# Altium footprint library B-NT_CHIPS.PcbLib: 90 footprints (part 2 of 6)
Each footprint in its own frame and in the unit in brackets; x right, y up, seen from the top. Pads: shape width x height; smd on the part's side, far side on the other; paste and mask are expansions set on the pad; w line width, h text height; cw(c..) or ccw(c..) is an arc to the next point about the centre after c.
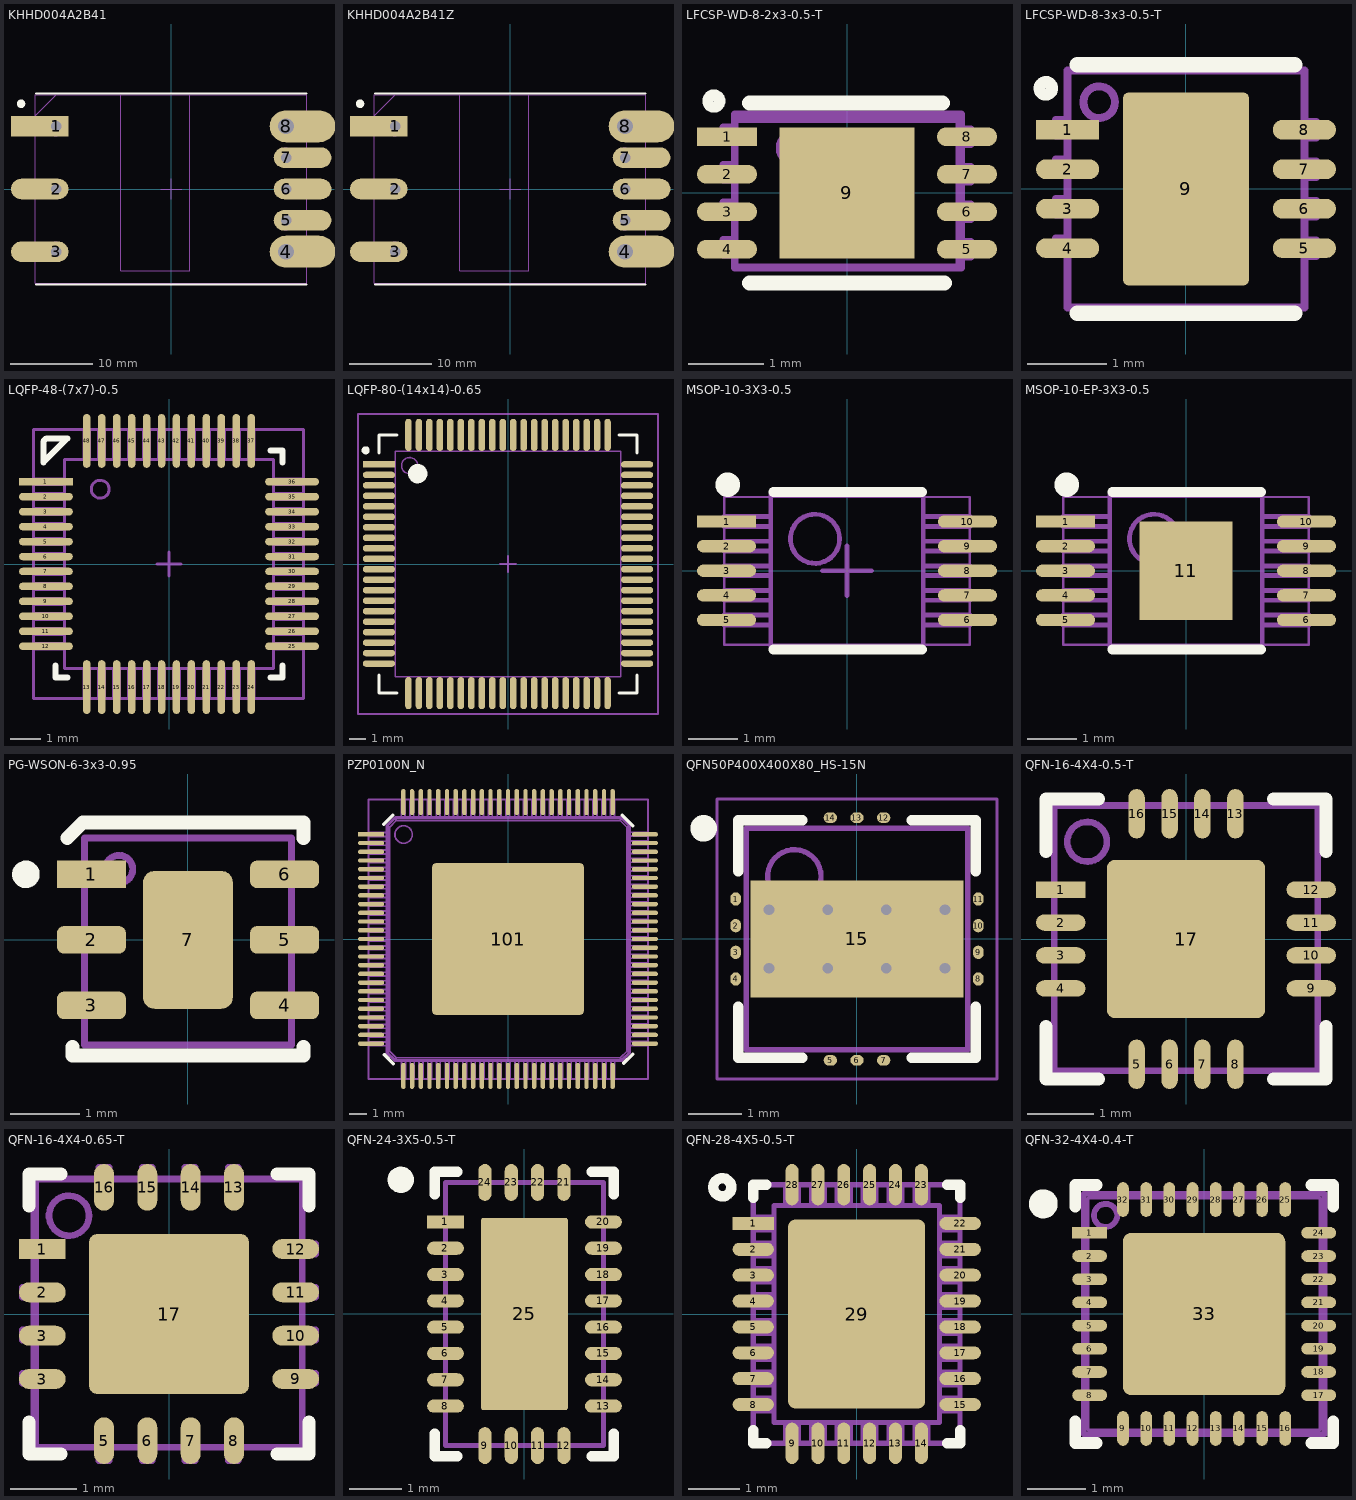
[diagram p1: the footprints below, top view; thin cyan lines are the x and y axes]

## KHHD004A2B41 [mm]
height 9.398
pads (8):
  rect 7x2.5 hole 1.27 copper offset -2,0: 1(-13.97,7.62)
  oval 7x2.5 hole 1.27 copper offset -2,0: 2(-13.97,0) 3(-13.97,-7.62)
  oval 8x3.9 hole 1.93 copper offset 2,0: 4(13.97,-7.62) 8(13.97,7.62)
  oval 7x2.5 hole 1.27 copper offset 2,0: 5(13.97,-3.81) 6(13.97,0) 7(13.97,3.81)
Top Overlay:
  circle w0.508: c-18.237,10.363 r0.254
  lines w0.2: -16.45,-11.6 0,-11.6 16.45,-11.6 ; -16.45,11.6 0,11.6 16.45,11.6
M3 Top Assy:
  circle w0.1: c13.97,-7.62 r1.524
  circle w0.1: c13.97,-3.81 r1.143
  circle w0.1: c13.97,0 r1.143
  circle w0.1: c13.97,3.81 r1.143
  circle w0.1: c13.97,7.62 r1.524
  circle w0.1: c-13.97,-7.62 r1.143
  circle w0.1: c-13.97,0 r1.143
  circle w0.1: c-13.97,7.62 r1.143
  lines w0.1: -6.096,11.43 -6.096,-9.906 2.286,-9.906 2.286,11.43 ; -16.51,-11.43 -16.51,8.89 -13.97,11.43 16.51,11.43 16.51,-11.43 -16.51,-11.43
M8 Top Brd Anno:
  lines w0.1: -1.27,0 1.27,0 ; 0,-1.27 0,1.27 ; -16.51,-11.43 16.51,-11.43 16.51,11.43 -16.51,11.43 -16.51,-11.43
3D body "KHHD004A2B41Z(PCB).STEP": height 9.31, standoff -4.79, extent -16.456,-11.419 16.544,11.481

## KHHD004A2B41Z [mm]
pads (8):
  rect 7x2.5 hole 1.27 copper offset -2,0: 1(-13.97,7.62)
  oval 7x2.5 hole 1.27 copper offset -2,0: 2(-13.97,0) 3(-13.97,-7.62)
  oval 8x3.9 hole 1.93 copper offset 2,0: 4(13.97,-7.62) 8(13.97,7.62)
  oval 7x2.5 hole 1.27 copper offset 2,0: 5(13.97,-3.81) 6(13.97,0) 7(13.97,3.81)
Top Overlay:
  circle w0.508: c-18.237,10.363 r0.254
  lines w0.2: -16.45,-11.6 0,-11.6 16.45,-11.6 ; -16.45,11.6 0,11.6 16.45,11.6
M3 Top Assy:
  circle w0.1: c-13.97,7.62 r1.143
  circle w0.1: c-13.97,0 r1.143
  circle w0.1: c-13.97,-7.62 r1.143
  circle w0.1: c13.97,7.62 r1.524
  circle w0.1: c13.97,3.81 r1.143
  circle w0.1: c13.97,0 r1.143
  circle w0.1: c13.97,-3.81 r1.143
  circle w0.1: c13.97,-7.62 r1.524
  lines w0.1: -6.096,11.43 -6.096,-9.906 2.286,-9.906 2.286,11.43 ; -16.51,-11.43 16.51,-11.43 16.51,11.43 -13.97,11.43 -16.51,8.89 -16.51,-11.43
M8 Top Brd Anno:
  lines w0.1: -1.27,0 1.27,0 ; 0,-1.27 0,1.27 ; -16.51,-11.43 -16.51,11.43 16.51,11.43 16.51,-11.43 -16.51,-11.43
3D body "KHHD004A2B41Z(PCB).STEP": height 9.31, standoff -4.79, extent -16.456,-11.419 16.544,11.481

## LFCSP-WD-8-2х3-0.5-T [mm]
height 0.85
pads (9):
  rect 0.8x0.25 smd: 1(-1.6,0.75)
  oval 0.8x0.25 smd: 2(-1.6,0.25) 3(-1.6,-0.25) 4(-1.6,-0.75) 5(1.6,-0.75) 6(1.6,-0.25) 7(1.6,0.25) 8(1.6,0.75)
  rect 1.8x1.75 smd: 9(0,0)
Top Overlay:
  circle w0.15: c-1.775,1.225 r0.08
  lines w0.2: -1.3,-1.2 1.3,-1.2 ; -1.3,1.2 1.275,1.2
M3 Top Assy:
  circle w0.1: c-0.7,0.6 r0.2
  lines w0.1: -1.55,-0.825 -1.65,-0.825 -1.65,-0.625 -1.55,-0.625 ; -1.55,-0.325 -1.65,-0.325 -1.65,-0.125 -1.55,-0.125 ; -1.55,0.175 -1.65,0.175 -1.65,0.375 -1.55,0.375 ; -1.55,0.675 -1.65,0.675 -1.65,0.875 -1.55,0.875 ; 1.55,-0.85 1.65,-0.85 1.65,-0.65 1.55,-0.65 ; 1.55,-0.35 1.65,-0.35 1.65,-0.15 1.55,-0.15 ; 1.55,0.15 1.65,0.15 1.65,0.35 1.55,0.35 ; 1.55,0.65 1.65,0.65 1.65,0.85 1.55,0.85 ; -1.5,-0.993 -1.5,0.982 1.499,0.982 1.5,0.982 1.5,-0.993 -1.5,-0.993
M8 Top Brd Anno:
  lines w0.1: -0.5,0 0.5,0 ; 0,-0.5 0,0.5 ; -1.5,-1 -1.5,1.05 0.2,1.05 1.525,1.05 1.525,-1 -0.25,-1 -1.5,-1
3D body "User Library-ADG1401BCPZ-REEL7.STEP": height 0.74, standoff -0.01, extent -1.501,-1 1.501,1

## LFCSP-WD-8-3х3-0.5-T [mm] "8-Lead Frame Chip Scale Package [LFCSP_WD]  3 mm ? 3 mm Body"
height 0.85
pads (9):
  rect 0.8x0.25 smd: 1(-1.5,0.75)
  oval 0.8x0.25 smd: 2(-1.5,0.25) 3(-1.5,-0.25) 4(-1.5,-0.75) 5(1.5,-0.75) 6(1.5,-0.25) 7(1.5,0.25) 8(1.5,0.75)
  rrect10% 1.6x2.45 smd: 9(0,0)
Top Overlay:
  circle w0.15: c-1.775,1.275 r0.08
  lines w0.2: -1.375,-1.575 1.375,-1.575 ; -1.375,1.575 1.375,1.575
M3 Top Assy:
  circle w0.1: c-1.1,1.1 r0.2
  lines w0.1: -1.55,-0.825 -1.65,-0.825 -1.65,-0.625 -1.55,-0.625 ; -1.55,-0.325 -1.65,-0.325 -1.65,-0.125 -1.55,-0.125 ; -1.55,0.175 -1.65,0.175 -1.65,0.375 -1.55,0.375 ; -1.55,0.675 -1.65,0.675 -1.65,0.875 -1.55,0.875 ; 1.55,-0.85 1.65,-0.85 1.65,-0.65 1.55,-0.65 ; 1.55,-0.35 1.65,-0.35 1.65,-0.15 1.55,-0.15 ; 1.55,0.15 1.65,0.15 1.65,0.35 1.55,0.35 ; 1.55,0.65 1.65,0.65 1.65,0.85 1.55,0.85 ; -1.5,-1.5 1.5,-1.5 1.5,1.5 -1.5,1.5 -1.5,-1.5
M8 Top Brd Anno:
  lines w0.1: -0.5,0 0.5,0 ; 0,-0.5 0,0.5 ; -1.5,-1.5 0,-1.5 1.5,-1.5 1.5,1.5 0,1.5 -1.5,1.5 -1.5,-1.5
3D body "User Library-DFN-8.STEP": height 0.75, standoff -0.05, extent -1.51,-1.5 1.51,1.5

## LQFP-48-(7x7)-0.5 [mm] "Body 7.2x7.2x1.6mm(max)"
height 1.6
pads (48):
  rect 1.8x0.25 smd: 1(-4.115,2.75)
  oval 1.8x0.25 smd: 2(-4.115,2.25) 3(-4.115,1.75) 4(-4.115,1.25) 5(-4.115,0.75) 6(-4.115,0.25) 7(-4.115,-0.25) 8(-4.115,-0.75) 9(-4.115,-1.25) 10(-4.115,-1.75) 11(-4.115,-2.25) 12(-4.115,-2.75) 25(4.115,-2.75) 26(4.115,-2.25) 27(4.115,-1.75) 28(4.115,-1.25) 29(4.115,-0.75) 30(4.115,-0.25) 31(4.115,0.25) 32(4.115,0.75) 33(4.115,1.25) 34(4.115,1.75) 35(4.115,2.25) 36(4.115,2.75)
  oval 0.25x1.8 smd: 13(-2.75,-4.115) 14(-2.25,-4.115) 15(-1.75,-4.115) 16(-1.25,-4.115) 17(-0.75,-4.115) 18(-0.25,-4.115) 19(0.25,-4.115) 20(0.75,-4.115) 21(1.25,-4.115) 22(1.75,-4.115) 23(2.25,-4.115) 24(2.75,-4.115) 37(2.75,4.115) 38(2.25,4.115) 39(1.75,4.115) 40(1.25,4.115) 41(0.75,4.115) 42(0.25,4.115) 43(-0.25,4.115) 44(-0.75,4.115) 45(-1.25,4.115) 46(-1.75,4.115) 47(-2.25,4.115) 48(-2.75,4.115)
Top Overlay:
  lines w0.2: -3.8,-3.4 -3.8,-3.8 -3.6,-3.8 -3.4,-3.8 ; 3.4,-3.8 3.8,-3.8 3.8,-3.6 3.8,-3.4 ; 3.4,3.8 3.6,3.8 3.8,3.8 3.8,3.4 ; -4.2,4.1 -4.1,4.2 ; -4.2,4.1 -4.2,3.4 -3.4,4.2 -4.1,4.2 ; -4.2,4.1 -4.1,4.2
M3 Top Assy:
  circle w0.1: c-2.3,2.5 r0.3
  lines w0.1: -3.5,-2.85 -4.5,-2.85 -4.5,-2.65 -3.5,-2.65 ; -3.5,-2.35 -4.5,-2.35 -4.5,-2.15 -3.5,-2.15 ; -3.5,-1.85 -4.5,-1.85 -4.5,-1.65 -3.5,-1.65 ; -3.5,-1.35 -4.5,-1.35 -4.5,-1.15 -3.5,-1.15 ; -3.5,-0.85 -4.5,-0.85 -4.5,-0.65 -3.5,-0.65 ; -3.5,-0.35 -4.5,-0.35 -4.5,-0.15 -3.5,-0.15 ; -3.5,0.15 -4.5,0.15 -4.5,0.35 -3.5,0.35 ; -3.5,0.65 -4.5,0.65 -4.5,0.85 -3.5,0.85 ; -3.5,1.15 -4.5,1.15 -4.5,1.35 -3.5,1.35 ; -3.5,1.65 -4.5,1.65 -4.5,1.85 -3.5,1.85 ; -3.5,2.15 -4.5,2.15 -4.5,2.35 -3.5,2.35 ; -3.5,2.65 -4.5,2.65 -4.5,2.85 -3.5,2.85 ; -2.85,-3.5 -2.85,-4.5 -2.65,-4.5 -2.65,-3.5 ; -2.85,3.5 -2.85,4.5 -2.65,4.5 -2.65,3.5 ; -2.35,-3.5 -2.35,-4.5 -2.15,-4.5 -2.15,-3.5 ; -2.35,3.5 -2.35,4.5 -2.15,4.5 -2.15,3.5 ; -1.85,-3.5 -1.85,-4.5 -1.65,-4.5 -1.65,-3.5 ; -1.85,3.5 -1.85,4.5 -1.65,4.5 -1.65,3.5 ; -1.35,-3.5 -1.35,-4.5 -1.15,-4.5 -1.15,-3.5 ; -1.35,3.5 -1.35,4.5 -1.15,4.5 -1.15,3.5 ; -0.85,-3.5 -0.85,-4.5 -0.65,-4.5 -0.65,-3.5 ; -0.85,3.5 -0.85,4.5 -0.65,4.5 -0.65,3.5 ; -0.35,-3.5 -0.35,-4.5 -0.15,-4.5 -0.15,-3.5 ; -0.35,3.5 -0.35,4.5 -0.15,4.5 -0.15,3.5 ; 0.15,-3.5 0.15,-4.5 0.35,-4.5 0.35,-3.5 ; 0.15,3.5 0.15,4.5 0.35,4.5 0.35,3.5 ; 0.65,-3.5 0.65,-4.5 0.85,-4.5 0.85,-3.5 ; 0.65,3.5 0.65,4.5 0.85,4.5 0.85,3.5 ; 1.15,-3.5 1.15,-4.5 1.35,-4.5 1.35,-3.5 ; 1.15,3.5 1.15,4.5 1.35,4.5 1.35,3.5 ; 1.65,-3.5 1.65,-4.5 1.85,-4.5 1.85,-3.5 ; 1.65,3.5 1.65,4.5 1.85,4.5 1.85,3.5 ; 2.15,-3.5 2.15,-4.5 2.35,-4.5 2.35,-3.5 ; 2.15,3.5 2.15,4.5 2.35,4.5 2.35,3.5 ; 2.65,-3.5 2.65,-4.5 2.85,-4.5 2.85,-3.5 ; 2.65,3.5 2.65,4.5 2.85,4.5 2.85,3.5 ; 3.5,-2.85 4.5,-2.85 4.5,-2.65 3.5,-2.65 ; 3.5,-2.35 4.5,-2.35 4.5,-2.15 3.5,-2.15 ; 3.5,-1.85 4.5,-1.85 4.5,-1.65 3.5,-1.65 ; 3.5,-1.35 4.5,-1.35 4.5,-1.15 3.5,-1.15 ; 3.5,-0.85 4.5,-0.85 4.5,-0.65 3.5,-0.65 ; 3.5,-0.35 4.5,-0.35 4.5,-0.15 3.5,-0.15 ; 3.5,0.15 4.5,0.15 4.5,0.35 3.5,0.35 ; 3.5,0.65 4.5,0.65 4.5,0.85 3.5,0.85 ; 3.5,1.15 4.5,1.15 4.5,1.35 3.5,1.35 ; 3.5,1.65 4.5,1.65 4.5,1.85 3.5,1.85 ; 3.5,2.15 4.5,2.15 4.5,2.35 3.5,2.35 ; 3.5,2.65 4.5,2.65 4.5,2.85 3.5,2.85 ; -3.5,-3.5 3.5,-3.5 3.5,3.5 -3.5,3.5 -3.5,-3.5
M8 Top Brd Anno:
  lines w0.1: -0.4,0 0.4,0 ; 0,-0.4 0,0.4 ; -4.525,-4.5 -4.525,4.5 0.75,4.5 4.5,4.5 4.5,-4.5 -1.85,-4.5 -4.525,-4.5
3D body "SW3dPS-LQFP48.STEP": height 1.5, standoff 0, extent -4.5,-4.5 4.5,4.5

## LQFP-80-(14x14)-0.65 [mm] "Body 14.0x14.0x1.6mm(max)"
height 1.6
pads (80):
  rect 2x0.4 smd: 1(-8,6.175)
  oval 2x0.4 smd: 2(-8,5.525) 3(-8,4.875) 4(-8,4.225) 5(-8,3.575) 6(-8,2.925) 7(-8,2.275) 8(-8,1.625) 9(-8,0.975) 10(-8,0.325) 11(-8,-0.325) 12(-8,-0.975) 13(-8,-1.625) 14(-8,-2.275) 15(-8,-2.925) 16(-8,-3.575) 17(-8,-4.225) 18(-8,-4.875) 19(-8,-5.525) 20(-8,-6.175) 41(8,-6.175) 42(8,-5.525) 43(8,-4.875) 44(8,-4.225) 45(8,-3.575) 46(8,-2.925) 47(8,-2.275) 48(8,-1.625) 49(8,-0.975) 50(8,-0.325) 51(8,0.325) 52(8,0.975) 53(8,1.625) 54(8,2.275) 55(8,2.925) 56(8,3.575) 57(8,4.225) 58(8,4.875) 59(8,5.525) 60(8,6.175)
  oval 0.4x2 smd: 21(-6.175,-8) 22(-5.525,-8) 23(-4.875,-8) 24(-4.225,-8) 25(-3.575,-8) 26(-2.925,-8) 27(-2.275,-8) 28(-1.625,-8) 29(-0.975,-8) 30(-0.325,-8) 31(0.325,-8) 32(0.975,-8) 33(1.625,-8) 34(2.275,-8) 35(2.925,-8) 36(3.575,-8) 37(4.225,-8) 38(4.875,-8) 39(5.525,-8) 40(6.175,-8) 61(6.175,8) 62(5.525,8) 63(4.875,8) 64(4.225,8) 65(3.575,8) 66(2.925,8) 67(2.275,8) 68(1.625,8) 69(0.975,8) 70(0.325,8) 71(-0.325,8) 72(-0.975,8) 73(-1.625,8) 74(-2.275,8) 75(-2.925,8) 76(-3.575,8) 77(-4.225,8) 78(-4.875,8) 79(-5.525,8) 80(-6.175,8)
Top Overlay:
  circle w0.25: c-8.825,7.05 r0.125
  circle w0.6: c-5.6,5.6 r0.3
  lines w0.2: -8,-6.875 -8,-8 -6.875,-8 ; -8,6.875 -8,8 -6.875,8 ; 6.875,-8 8,-8 8,-6.875 ; 6.875,8 8,8 8,6.875
M3 Top Assy:
  circle w0.1: c-6.1,6.1 r0.5
  lines w0.1: -7,-7 -7,7 7,7 7,-7 -7,-7
M8 Top Brd Anno:
  lines w0.1: -0.5,0 0.5,0 ; 0,-0.5 0,0.5 ; -9.3,-9.3 -9.3,9.3 9.3,9.3 9.3,-9.3 -9.3,-9.3
3D body "LQFP.step": height 1.6, standoff 0, extent -8,-8 8,8

## MSOP-10-3X3-0.5 [mm] "MSOP-10, Body 3x3mm"
height 1
pads (10):
  rect 1.2x0.25 smd: 1(-2.45,1)
  oval 1.2x0.25 smd: 2(-2.45,0.5) 3(-2.45,0) 4(-2.45,-0.5) 5(-2.45,-1) 6(2.45,-1) 7(2.45,-0.5) 8(2.45,0) 9(2.45,0.5) 10(2.45,1)
Top Overlay:
  circle w0.25: c-2.425,1.75 r0.125
  lines w0.2: -1.5,-1.6 1.525,-1.6 ; -1.5,1.6 1.525,1.6
M3 Top Assy:
  circle w0.1: c-0.65,0.65 r0.5
  lines w0.1: -1.55,-1.1 -2.5,-1.1 -2.5,-0.9 -1.55,-0.9 ; -1.55,-0.6 -2.5,-0.6 -2.5,-0.4 -1.55,-0.4 ; -1.55,-0.1 -2.5,-0.1 -2.5,0.1 -1.55,0.1 ; -1.55,0.4 -2.5,0.4 -2.5,0.6 -1.55,0.6 ; -1.55,0.9 -2.5,0.9 -2.5,1.1 -1.55,1.1 ; 1.55,-1.1 2.5,-1.1 2.5,-0.9 1.55,-0.9 ; 1.55,-0.6 2.5,-0.6 2.5,-0.4 1.55,-0.4 ; 1.55,-0.1 2.5,-0.1 2.5,0.1 1.55,0.1 ; 1.55,0.4 2.5,0.4 2.5,0.6 1.55,0.6 ; 1.55,0.9 2.5,0.9 2.5,1.1 1.55,1.1 ; -1.55,-1.55 1.55,-1.55 1.55,1.55 -1.55,1.55 -1.55,-1.55
M8 Top Brd Anno:
  lines w0.05: -2.5,-1.5 2.5,-1.5 2.5,1.5 -2.5,1.5 -2.5,-1.5
  lines w0.1: -0.5,0 0.5,0 ; 0,-0.5 0,0.5
3D body "SW3dPS-TSSOP-10.STEP": height 1.1, standoff 0, extent -2.5,-1.5 2.5,1.5

## MSOP-10-EP-3X3-0.5 [mm] "MSOP-10, Body 3x3mm"
height 1
pads (11):
  rect 1.2x0.25 smd: 1(-2.45,1)
  oval 1.2x0.25 smd: 2(-2.45,0.5) 3(-2.45,0) 4(-2.45,-0.5) 5(-2.45,-1) 6(2.45,-1) 7(2.45,-0.5) 8(2.45,0) 9(2.45,0.5) 10(2.45,1)
  rect 1.9x2 smd: 11(0,0)
Top Overlay:
  circle w0.25: c-2.425,1.75 r0.125
  lines w0.2: -1.5,-1.6 1.525,-1.6 ; -1.5,1.6 1.525,1.6
M3 Top Assy:
  circle w0.1: c-0.65,0.65 r0.5
  lines w0.1: -1.55,-1.1 -2.5,-1.1 -2.5,-0.9 -1.55,-0.9 ; -1.55,-0.6 -2.5,-0.6 -2.5,-0.4 -1.55,-0.4 ; -1.55,-0.1 -2.5,-0.1 -2.5,0.1 -1.55,0.1 ; -1.55,0.4 -2.5,0.4 -2.5,0.6 -1.55,0.6 ; -1.55,0.9 -2.5,0.9 -2.5,1.1 -1.55,1.1 ; 1.55,-1.1 2.5,-1.1 2.5,-0.9 1.55,-0.9 ; 1.55,-0.6 2.5,-0.6 2.5,-0.4 1.55,-0.4 ; 1.55,-0.1 2.5,-0.1 2.5,0.1 1.55,0.1 ; 1.55,0.4 2.5,0.4 2.5,0.6 1.55,0.6 ; 1.55,0.9 2.5,0.9 2.5,1.1 1.55,1.1 ; -1.55,-1.55 1.55,-1.55 1.55,1.55 -1.55,1.55 -1.55,-1.55
M8 Top Brd Anno:
  lines w0.05: -2.5,-1.5 2.5,-1.5 2.5,1.5 -2.5,1.5 -2.5,-1.5
  lines w0.1: -0.5,0 0.5,0 ; 0,-0.5 0,0.5
3D body "MSOP-10_MSE.step": height 1.09, standoff -0.05, extent -2.527,-1.549 2.527,1.549

## PG-WSON-6-3х3-0.95 [mm]
height 0.8
pads (7):
  rect 1x0.4 smd: 1(-1.4,0.95)
  rrect50% 1x0.4 smd: 2(-1.4,0) 3(-1.4,-0.95) 4(1.4,-0.95) 5(1.4,0) 6(1.4,0.95)
  rrect25% 1.3x2 smd: 7(0,0)
Top Overlay:
  circle w0.2: c-2.35,0.95 r0.1
  lines w0.2: -1.75,1.475 -1.525,1.7 1.675,1.7 1.675,1.475 ; -1.675,-1.55 -1.675,-1.675 1.675,-1.675 1.675,-1.55
M3 Top Assy:
  circle w0.1: c-1,1.025 r0.2
  lines w0.1: -1.5,-1.525 -1.5,1.475 1.5,1.475 1.5,-1.525 -1.5,-1.525
M8 Top Brd Anno:
  lines w0.1: -0.4,0 0.4,0 ; 0,-0.4 0,0.4 ; -1.5,-1.525 -1.5,1.475 0,1.475 1.5,1.475 1.5,-1.525 0,-1.525 -1.5,-1.525
3D body "PG-WSON-6-1 (1EDN7512GXTMA1).STEP": height 0.8, standoff 0, extent -1.5,-1.5 1.5,1.5

## PZP0100N_N [mm] "100-HTQFP (14x14)"
height 1.2
pads (101):
  rect 1.5x0.25 smd: 1(-7.85,6)
  oval 1.5x0.25 smd: 2(-7.85,5.5) 3(-7.85,5) 4(-7.85,4.5) 5(-7.85,4) 6(-7.85,3.5) 7(-7.85,3) 8(-7.85,2.5) 9(-7.85,2) 10(-7.85,1.5) 11(-7.85,1) 12(-7.85,0.5) 13(-7.85,0) 14(-7.85,-0.5) 15(-7.85,-1) 16(-7.85,-1.5) 17(-7.85,-2) 18(-7.85,-2.5) 19(-7.85,-3) 20(-7.85,-3.5) 21(-7.85,-4) 22(-7.85,-4.5) 23(-7.85,-5) 24(-7.85,-5.5) 25(-7.85,-6) 51(7.85,-6) 52(7.85,-5.5) 53(7.85,-5) 54(7.85,-4.5) 55(7.85,-4) 56(7.85,-3.5) 57(7.85,-3) 58(7.85,-2.5) 59(7.85,-2) 60(7.85,-1.5) 61(7.85,-1) 62(7.85,-0.5) 63(7.85,0) 64(7.85,0.5) 65(7.85,1) 66(7.85,1.5) 67(7.85,2) 68(7.85,2.5) 69(7.85,3) 70(7.85,3.5) 71(7.85,4) 72(7.85,4.5) 73(7.85,5) 74(7.85,5.5) 75(7.85,6)
  oval 0.25x1.5 smd: 26(-6,-7.85) 27(-5.5,-7.85) 28(-5,-7.85) 29(-4.5,-7.85) 30(-4,-7.85) 31(-3.5,-7.85) 32(-3,-7.85) 33(-2.5,-7.85) 34(-2,-7.85) 35(-1.5,-7.85) 36(-1,-7.85) 37(-0.5,-7.85) 38(0,-7.85) 39(0.5,-7.85) 40(1,-7.85) 41(1.5,-7.85) 42(2,-7.85) 43(2.5,-7.85) 44(3,-7.85) 45(3.5,-7.85) 46(4,-7.85) 47(4.5,-7.85) 48(5,-7.85) 49(5.5,-7.85) 50(6,-7.85) 76(6,7.85) 77(5.5,7.85) 78(5,7.85) 79(4.5,7.85) 80(4,7.85) 81(3.5,7.85) 82(3,7.85) 83(2.5,7.85) 84(2,7.85) 85(1.5,7.85) 86(1,7.85) 87(0.5,7.85) 88(0,7.85) 89(-0.5,7.85) 90(-1,7.85) 91(-1.5,7.85) 92(-2,7.85) 93(-2.5,7.85) 94(-3,7.85) 95(-3.5,7.85) 96(-4,7.85) 97(-4.5,7.85) 98(-5,7.85) 99(-5.5,7.85) 100(-6,7.85)
  rrect5% 8.7x8.7 smd: 101(0,0)
Top Overlay:
  lines w0.2: -7.125,6.575 -6.6,7.1 ; -7.1,-6.625 -6.575,-7.15 ; 6.55,7.1 7.15,6.5 ; 6.625,-7.125 7.15,-6.6
  text "." at -7.85,6.675 h0.05
M3 Top Assy:
  drawing of 2400 lines, arcs and shapes, not listed
M8 Top Brd Anno:
  lines w0.1: -0.8,0 0.8,0 ; 0,-0.8 0,0.8 ; -8,-8.025 0.725,-8.025 8.025,-8.025 8.025,8 -0.75,8 -8,8 -8,-8.025
3D body "PZP0100N.stp": height 1.1, standoff 0, extent -8.015,-8.015 8.016,8.016

## QFN50P400X400X80_HS-15N [mm] "QFN, 14-Leads, Body 4,00x4,00mm, Pitch 0,50mm, Thermal Pad 4,00x2,20mm, IPC Medium Density"
height 0.8
pads (15):
  oval 0.2x0.25 smd: 1(-2.275,0.75) 2(-2.275,0.25) 3(-2.275,-0.25) 4(-2.275,-0.75) 8(2.275,-0.75) 9(2.275,-0.25) 10(2.275,0.25) 11(2.275,0.75)
  oval 0.25x0.2 smd: 5(-0.5,-2.275) 6(0,-2.275) 7(0.5,-2.275) 12(0.5,2.275) 13(0,2.275) 14(-0.5,2.275)
  rect 4x2.2 smd: 15(0,0)
via -1.65,0.55 diameter 0.5 hole 0.2
via -0.55,0.55 diameter 0.5 hole 0.2
via 0.55,0.55 diameter 0.5 hole 0.2
via 1.65,0.55 diameter 0.5 hole 0.2
via -1.65,-0.55 diameter 0.5 hole 0.2
via -0.55,-0.55 diameter 0.5 hole 0.2
via 0.55,-0.55 diameter 0.5 hole 0.2
via 1.65,-0.55 diameter 0.5 hole 0.2
Top Overlay:
  circle w0.25: c-2.875,2.075 r0.125
  lines w0.2: -2.225,-1.275 -2.225,-2.225 -1.025,-2.225 ; -2.225,1.275 -2.225,2.225 -1.025,2.225 ; 1.025,-2.225 2.225,-2.225 2.225,-1.275 ; 1.025,2.225 2.225,2.225 2.225,1.275
M8 Top Brd Anno:
  lines w0.1: -0.5,0 0.5,0 ; 0,-0.5 0,0.5 ; -2.075,-2.075 -2.075,2.075 0,2.075 2.075,2.075 2.075,-2.075 -2.075,-2.075
Mechanical 13:
  circle w0.1: c-1.175,1.175 r0.5
  lines w0.1: -2.075,-2.075 -2.075,2.075 2.075,2.075 2.075,-2.075 -2.075,-2.075
Mechanical 15:
  lines w0.05: -2.625,-2.625 -2.625,2.625 2.625,2.625 2.625,-2.625 -2.625,-2.625
  lines w0.1: -0.5,0 0.5,0 ; 0,-0.5 0,0.5
3D body: height 0.8, standoff 0.01, extent -2.075,-2.075 2.075,2.075

## QFN-16-4X4-0.5-T [mm] "QFN, 16-Leads with exposed die pad, Body 4.1x4.1mm (max), Pitch 0.50mm, IPC Medium Density"
height 0.8
pads (17):
  rect 0.75x0.25 smd: 1(-1.9,0.75)
  oval 0.75x0.25 smd: 2(-1.9,0.25) 3(-1.9,-0.25) 4(-1.9,-0.75) 9(1.9,-0.75) 10(1.9,-0.25) 11(1.9,0.25) 12(1.9,0.75)
  oval 0.25x0.75 smd: 5(-0.75,-1.9) 6(-0.25,-1.9) 7(0.25,-1.9) 8(0.75,-1.9) 13(0.75,1.9) 14(0.25,1.9) 15(-0.25,1.9) 16(-0.75,1.9)
  rrect10% 2.4x2.4 smd: 17(0,0)
Top Overlay:
  lines w0.2: -2.125,-1.325 -2.125,-2.125 -1.325,-2.125 ; -2.125,1.325 -2.125,2.125 -1.325,2.125 ; 1.325,-2.125 2.125,-2.125 2.125,-1.325 ; 1.325,2.125 2.125,2.125 2.125,1.325
  text "." at -2.5,1.425 h0.05
M3 Top Assy:
  circle w0.1: c-1.5,1.475 r0.3
  lines w0.1: -2,-2 -2,2.025 2,2.025 2,-2 -2,-2
M8 Top Brd Anno:
  lines w0.05: -2.025,-2 -2.025,2.025 2,2.025 2,-2 -2.025,-2
  lines w0.1: -0.5,0 0.5,0 ; 0,-0.5 0,0.5
3D body "User Library-WQFN-16 4x4mm 0_5mmPitch.STEP": height 0.8, standoff -0.01, extent -2.01,-2 2.01,2.02

## QFN-16-4X4-0.65-T [mm] "QFN, 16-Leads with exposed die pad, Body 4.1x4.1mm (max), Pitch 0.650mm, IPC Medium Density"
height 0.8
pads (17):
  rect 0.7x0.3 smd: 1(-1.9,0.975)
  oval 0.7x0.3 smd: 2(-1.9,0.325) 3(-1.9,-0.975) 3(-1.9,-0.325) 9(1.9,-0.975) 10(1.9,-0.325) 11(1.9,0.325) 12(1.9,0.975)
  oval 0.3x0.7 smd: 5(-0.975,-1.9) 6(-0.325,-1.9) 7(0.325,-1.9) 8(0.975,-1.9) 13(0.975,1.9) 14(0.325,1.9) 15(-0.325,1.9) 16(-0.975,1.9)
  rrect10% 2.4x2.4 smd: 17(0,0)
Top Overlay:
  lines w0.2: -2.1,-1.625 -2.1,-2.1 -1.625,-2.1 ; -2.1,1.625 -2.1,2.1 -1.625,2.1 ; 1.625,-2.1 2.1,-2.1 2.1,-1.625 ; 1.625,2.1 2.1,2.1 2.1,1.625
  text "." at -2.5,1.475 h0.05
M3 Top Assy:
  circle w0.1: c-1.5,1.475 r0.3
  lines w0.1: -2.05,-1.04 -2.2,-1.04 -2.2,-0.89 -2.05,-0.89 ; -2.05,-0.39 -2.2,-0.39 -2.2,-0.24 -2.05,-0.24 ; -2.05,0.25 -2.2,0.25 -2.2,0.4 -2.05,0.4 ; -2.05,0.9 -2.2,0.9 -2.2,1.05 -2.05,1.05 ; -1.05,-2.05 -1.05,-2.2 -0.9,-2.2 -0.9,-2.05 ; -1.05,2.05 -1.05,2.2 -0.9,2.2 -0.9,2.05 ; -0.4,-2.05 -0.4,-2.2 -0.25,-2.2 -0.25,-2.05 ; -0.4,2.05 -0.4,2.2 -0.25,2.2 -0.25,2.05 ; 0.24,-2.05 0.24,-2.2 0.39,-2.2 0.39,-2.05 ; 0.24,2.05 0.24,2.2 0.39,2.2 0.39,2.05 ; 0.89,-2.05 0.89,-2.2 1.04,-2.2 1.04,-2.05 ; 0.89,2.05 0.89,2.2 1.04,2.2 1.04,2.05 ; 2.05,-1.04 2.2,-1.04 2.2,-0.89 2.05,-0.89 ; 2.05,-0.39 2.2,-0.39 2.2,-0.24 2.05,-0.24 ; 2.05,0.25 2.2,0.25 2.2,0.4 2.05,0.4 ; 2.05,0.9 2.2,0.9 2.2,1.05 2.05,1.05 ; -2,-2 -2,2.025 2,2.025 2,-2 -2,-2
M8 Top Brd Anno:
  lines w0.1: -0.5,0 0.5,0 ; 0,-0.5 0,0.5 ; -2.025,-2 -2.025,2.025 2,2.025 2,-2 -2.025,-2
3D body "QFN16_4x4x1_0_p0_65.step": height 1, standoff 0, extent -2.002,-2.002 2.002,2.002

## QFN-24-3X5-0.5-T [mm] "QFN, 24-Leads with exposed pad, Body 3x5mm, Pitch 0.50mm"
height 0.8
pads (25):
  rect 0.7x0.25 smd: 1(-1.5,1.75)
  oval 0.7x0.25 smd: 2(-1.5,1.25) 3(-1.5,0.75) 4(-1.5,0.25) 5(-1.5,-0.25) 6(-1.5,-0.75) 7(-1.5,-1.25) 8(-1.5,-1.75) 13(1.5,-1.75) 14(1.5,-1.25) 15(1.5,-0.75) 16(1.5,-0.25) 17(1.5,0.25) 18(1.5,0.75) 19(1.5,1.25) 20(1.5,1.75)
  oval 0.25x0.7 smd: 9(-0.75,-2.5) 10(-0.25,-2.5) 11(0.25,-2.5) 12(0.75,-2.5) 21(0.75,2.5) 22(0.25,2.5) 23(-0.25,2.5) 24(-0.75,2.5)
  rrect5% 1.65x3.65 smd: 25(0,0)
Top Overlay:
  circle w0.25: c-2.35,2.55 r0.125
  lines w0.2: -1.7,-2.275 -1.7,-2.7 -1.275,-2.7 ; -1.7,2.275 -1.7,2.7 -1.275,2.7 ; 1.275,-2.7 1.7,-2.7 1.7,-2.275 ; 1.275,2.7 1.7,2.7 1.7,2.275
M3 Top Assy:
  lines w0.1: -0.5,0 0.5,0 ; 0,-0.5 0,0.5 ; -1.5,-2.5 1.5,-2.5 1.5,2.5 -1.5,2.5 -1.5,-2.5
M8 Top Brd Anno:
  lines w0.05: -1.5,-2.5 -1.5,2.5 1.5,2.5 1.5,-2.5 -1.5,-2.5
  lines w0.1: -0.5,0 0.5,0 ; 0,-0.5 0,0.5
3D body "QFN50P300X500X80_HS-25N.step": height 0.8, standoff 0, extent -1.551,-2.551 1.551,2.551

## QFN-28-4X5-0.5-T [mm] "QFN, 28-Leads with exposed pad, Body 4x5mm, Pitch 0.50mm"
height 0.8
pads (29):
  rect 0.8x0.25 smd: 1(-2,1.75)
  oval 0.8x0.25 smd: 2(-2,1.25) 3(-2,0.75) 4(-2,0.25) 5(-2,-0.25) 6(-2,-0.75) 7(-2,-1.25) 8(-2,-1.75) 15(2,-1.75) 16(2,-1.25) 17(2,-0.75) 18(2,-0.25) 19(2,0.25) 20(2,0.75) 21(2,1.25) 22(2,1.75)
  oval 0.25x0.8 smd: 9(-1.25,-2.5) 10(-0.75,-2.5) 11(-0.25,-2.5) 12(0.25,-2.5) 13(0.75,-2.5) 14(1.25,-2.5) 23(1.25,2.5) 24(0.75,2.5) 25(0.25,2.5) 26(-0.25,2.5) 27(-0.75,2.5) 28(-1.25,2.5)
  rrect10% 2.65x3.65 smd: 29(0,0)
Top Overlay:
  circle w0.2: c-2.6,2.45 r0.175
  lines w0.2: -2,-2.25 -2,-2.5 -1.75,-2.5 ; -2,2.25 -2,2.5 -1.75,2.5 ; 1.75,-2.5 2,-2.5 2,-2.25 ; 1.75,2.5 2,2.5 2,2.25
M3 Top Assy:
  circle w0.1: c-0.875,1.45 r0.215
  lines w0.1: -1.6,-1.875 -2,-1.875 -2,-1.625 -1.6,-1.625 ; -1.6,-1.375 -2,-1.375 -2,-1.125 -1.6,-1.125 ; -1.6,-0.875 -2,-0.875 -2,-0.625 -1.6,-0.625 ; -1.6,-0.375 -2,-0.375 -2,-0.125 -1.6,-0.125 ; -1.6,0.125 -2,0.125 -2,0.375 -1.6,0.375 ; -1.6,0.625 -2,0.625 -2,0.875 -1.6,0.875 ; -1.6,1.125 -2,1.125 -2,1.375 -1.6,1.375 ; -1.6,1.625 -2,1.625 -2,1.875 -1.6,1.875 ; -1.375,-2.1 -1.375,-2.5 -1.125,-2.5 -1.125,-2.1 ; -1.375,2.1 -1.375,2.5 -1.125,2.5 -1.125,2.1 ; -0.875,-2.1 -0.875,-2.5 -0.625,-2.5 -0.625,-2.1 ; -0.875,2.1 -0.875,2.5 -0.625,2.5 -0.625,2.1 ; -0.375,-2.1 -0.375,-2.5 -0.125,-2.5 -0.125,-2.1 ; -0.375,2.1 -0.375,2.5 -0.125,2.5 -0.125,2.1 ; 0.125,-2.1 0.125,-2.5 0.375,-2.5 0.375,-2.1 ; 0.125,2.1 0.125,2.5 0.375,2.5 0.375,2.1 ; 0.625,-2.1 0.625,-2.5 0.875,-2.5 0.875,-2.1 ; 0.625,2.1 0.625,2.5 0.875,2.5 0.875,2.1 ; 1.125,-2.1 1.125,-2.5 1.375,-2.5 1.375,-2.1 ; 1.125,2.1 1.125,2.5 1.375,2.5 1.375,2.1 ; 1.6,-1.875 2,-1.875 2,-1.625 1.6,-1.625 ; 1.6,-1.375 2,-1.375 2,-1.125 1.6,-1.125 ; 1.6,-0.875 2,-0.875 2,-0.625 1.6,-0.625 ; 1.6,-0.375 2,-0.375 2,-0.125 1.6,-0.125 ; 1.6,0.125 2,0.125 2,0.375 1.6,0.375 ; 1.6,0.625 2,0.625 2,0.875 1.6,0.875 ; 1.6,1.125 2,1.125 2,1.375 1.6,1.375 ; 1.6,1.625 2,1.625 2,1.875 1.6,1.875 ; -1.6,-2.1 1.6,-2.1 1.6,2.1 -1.6,2.1 -1.6,-2.1
M8 Top Brd Anno:
  lines w0.1: -0.5,0 0.5,0 ; 0,-0.5 0,0.5 ; -2,-2.5 2,-2.5 2,2.5 -2,2.5 -2,-2.5
3D body "QFN-28-4X5-0.5-T.step": height 0.75, standoff 0, extent -2.005,-2.505 2.005,2.505

## QFN-32-4X4-0.4-T [mm] "QFN, 32-Leads with exposed die pad, Body 5.1x5.1mm (max), Pitch 0.50mm, IPC Medium Density"
height 0.8
pads (33):
  rect 0.6x0.2 smd: 1(-1.975,1.4)
  oval 0.6x0.2 smd: 2(-1.975,1) 3(-1.975,0.6) 4(-1.975,0.2) 5(-1.975,-0.2) 6(-1.975,-0.6) 7(-1.975,-1) 8(-1.975,-1.4) 17(1.975,-1.4) 18(1.975,-1) 19(1.975,-0.6) 20(1.975,-0.2) 21(1.975,0.2) 22(1.975,0.6) 23(1.975,1) 24(1.975,1.4)
  oval 0.2x0.6 smd: 9(-1.4,-1.975) 10(-1,-1.975) 11(-0.6,-1.975) 12(-0.2,-1.975) 13(0.2,-1.975) 14(0.6,-1.975) 15(1,-1.975) 16(1.4,-1.975) 25(1.4,1.975) 26(1,1.975) 27(0.6,1.975) 28(0.2,1.975) 29(-0.2,1.975) 30(-0.6,1.975) 31(-1,1.975) 32(-1.4,1.975)
  rrect10% 2.8x2.8 smd: 33(0,0)
Top Overlay:
  circle w0.25: c-2.775,1.9 r0.125
  lines w0.2: -2.225,-1.85 -2.225,-2.225 -1.85,-2.225 ; -2.225,1.85 -2.225,2.225 -1.85,2.225 ; 1.85,-2.225 2.225,-2.225 2.225,-1.85 ; 1.85,2.225 2.225,2.225 2.225,1.85
M3 Top Assy:
  circle w0.1: c-1.7,1.7 r0.2
  lines w0.1: -2.075,-2.075 -2.075,2.075 2.075,2.075 2.075,-2.075 -2.075,-2.075
M8 Top Brd Anno:
  lines w0.05: -2,-2 2,-2 2,2 -2,2 -2,-2
3D body "User Library-QFN 32.step": height 0.57, standoff -0.04, extent -2.001,-2.001 2.001,2.001